# Altium footprint library 封装库.PcbLib: 755 footprints (part 4 of 48)
Each footprint in its own frame and in the unit in brackets; x right, y up, seen from the top. Pads: shape width x height; smd on the part's side, far side on the other; paste and mask are expansions set on the pad; w line width, h text height; cw(c..) or ccw(c..) is an arc to the next point about the centre after c.
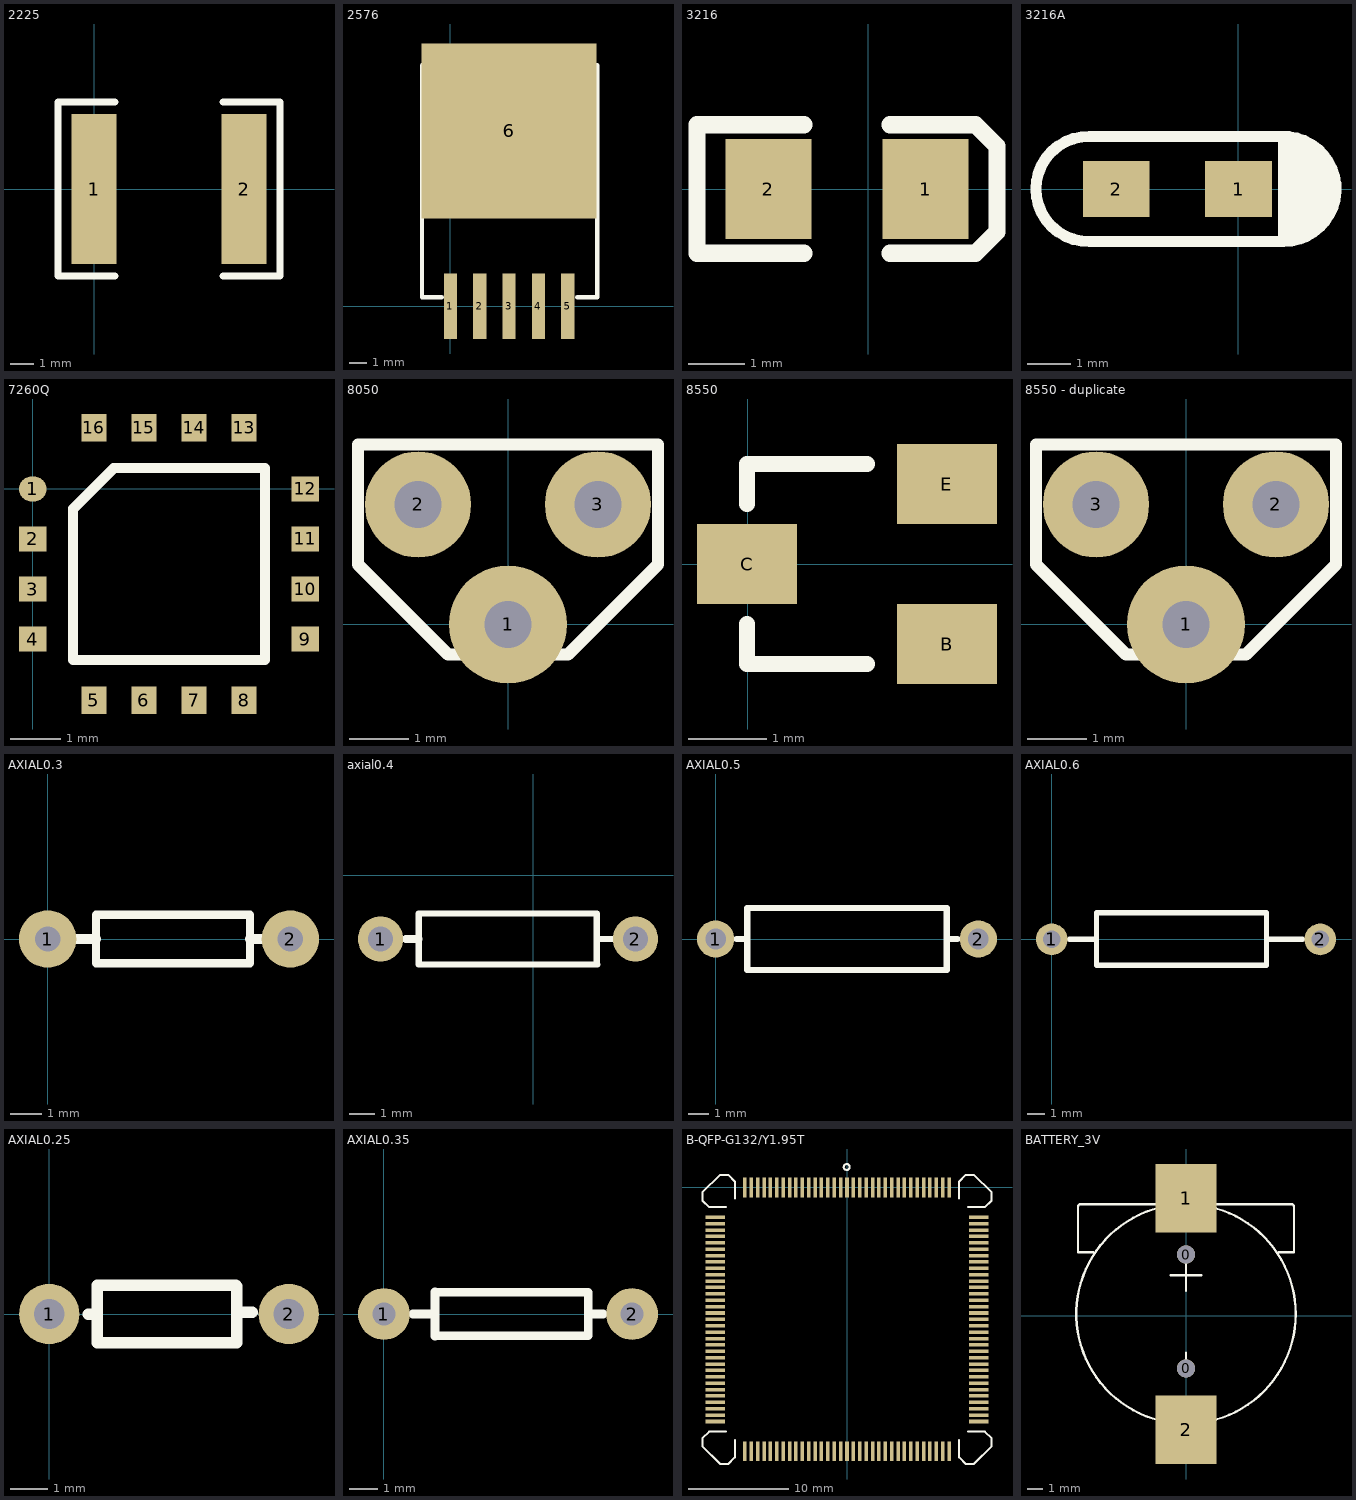
[diagram p3: the footprints below, top view; thin cyan lines are the x and y axes]

## 2225 [mm]
pads (2):
  rect 1.905x6.35 smd: 1(0,0) 2(6.35,0)
Top Overlay:
  lines w0.305: 0.889,-3.683 -1.524,-3.683 -1.524,3.683 0.889,3.683 ; 5.461,-3.683 7.874,-3.683 7.874,3.683 5.461,3.683

## 2576 [mil]
pads (6):
  rect 30x150 smd: 1(0,0) 2(67,0) 3(134,0) 4(201,0) 5(268,0)
  rect 400x400 smd: 6(134,400)
Top Overlay:
  lines w10: -20,20 -65,20 -65,550 335,550 335,20 290,20

## 3216 [mil]
pads (2):
  rect 60x70 smd: 1(40,0) 2(-70,0)
Top Overlay:
  lines w12: -45,-45 -120,-45 -120,45 -45,45 ; 15,-45 75,-45 90,-30 90,30 75,45 15,45

## 3216A [mil]
pads (2):
  rect 60x50 smd: 1(0.16,0.23) 2(-109.84,0.23)
Top Overlay:
  rectangle: 42.48,-40.13 66.1,43.54
  rectangle: 69.06,-9.61 85.79,16.96
  rectangle: 66.1,-31.27 81.85,30.74
  rectangle: 57.24,-36.19 71.02,38.61
  rectangle: 45.43,-43.08 62.17,41.57
  lines w10: -133.7,-47.02 40.51,-47.02 ; -133.71,47.47 39.53,47.47 ; -133.66,-47.01 cw(c-134.69,0.23) -133.66,47.47 ; 38.26,47.42 cw(c40.51,0.23) 40.51,-47.02 ; 40.51,45.51 40.51,-47.02

## 7260Q [mm]
pads (16):
  oval 0.55x0.5 smd: 1(0,0)
  rect 0.55x0.5 smd: 2(0,-1) 3(0,-2) 4(0,-3) 9(5.45,-3) 10(5.45,-2) 11(5.45,-1) 12(5.45,0)
  rect 0.5x0.55 smd: 5(1.225,-4.225) 6(2.225,-4.225) 7(3.225,-4.225) 8(4.225,-4.225) 13(4.225,1.225) 14(3.225,1.225) 15(2.225,1.225) 16(1.225,1.225)
Top Overlay:
  lines w0.2: 0.81,-3.415 0.81,-0.395 1.62,0.415 4.64,0.415 4.64,-3.415 0.81,-3.415

## 8050 [mm]
pads (3):
  round 2 hole 0.8: 1(0,0)
  round 1.8 hole 0.8: 2(-1.524,2.032) 3(1.524,2.032)
Top Overlay:
  lines w0.203: -2.54,1.016 -1.016,-0.508 1.016,-0.508 2.54,1.016 2.54,3.048 -2.54,3.048 -2.54,1.016

## 8550 [mil]
pads (3):
  rect 50x40 smd: B(99.7,-40) C(-0.3,0) E(99.7,40)
Top Overlay:
  lines w8: -0.3,-30 -0.3,-50 59.7,-50 ; -0.3,30 -0.3,50 59.7,50

## 8550 - duplicate [mm]
pads (3):
  round 2 hole 0.8: 1(0,0)
  round 1.8 hole 0.8: 2(1.524,2.032) 3(-1.524,2.032)
Top Overlay:
  lines w0.203: -2.54,1.016 -1.016,-0.508 1.016,-0.508 2.54,1.016 2.54,3.048 -2.54,3.048 -2.54,1.016

## AXIAL0.3 [mm]
pads (2):
  round 1.8 hole 0.8: 1(0,0) 2(7.62,0)
Top Overlay:
  lines w0.254: 1.524,-0.762 1.524,0.762 6.35,0.762 6.35,-0.762 1.524,-0.762
  lines w0.305: 0.762,0 1.524,0 ; 6.35,0 6.858,0

## axial0.4 [mm]
pads (2):
  round 1.8 hole 1: 1(-6.096,-2.54) 2(4.064,-2.54)
Top Overlay:
  lines w0.254: 2.516,-3.532 2.516,-1.524 -4.572,-1.524 -4.572,-3.556 2.54,-3.556 ; 2.516,-2.54 3.302,-2.54
  lines w0.305: -5.08,-2.54 -4.572,-2.54

## AXIAL0.5 [mm]
pads (2):
  round 1.8 hole 1: 1(0,0) 2(12.7,0)
Top Overlay:
  lines w0.3: 11.176,-1.5 11.176,1.5
  lines w0.305: 1.016,0 1.524,0 ; 11.176,-1.5 1.524,-1.5 1.524,1.5 11.176,1.5 ; 11.176,0 11.684,0

## AXIAL0.6 [mm]
pads (2):
  round 1.8 hole 1: 1(0,0) 2(15.24,0)
Top Overlay:
  lines w0.3: 12.192,-1.476 12.192,1.524
  lines w0.305: 1.016,0 2.54,0 ; 12.192,-1.476 2.54,-1.476 2.54,1.524 12.192,1.524 ; 12.192,0 14.224,0

## AXIAL0.25 [mm]
pads (2):
  round 1.6 hole 0.8: 1(0,0) 2(6.35,0)
Top Overlay:
  lines w0.3: 1.27,-0.762 4.974,-0.762 4.974,0.738 4.95,0.762 1.27,0.762
  lines w0.305: 1.041,0 1.27,0 ; 1.27,-0.762 1.27,0.762 ; 5.148,0.042 5.377,0.042

## AXIAL0.35 [mm]
pads (2):
  round 1.8 hole 0.8: 1(0,0) 2(8.636,0)
Top Overlay:
  lines w0.3: 1.778,-0.762 1.778,0.762 7.112,0.762 7.112,0 7.112,-0.762 1.778,-0.762
  lines w0.305: 1.016,0 1.778,0 ; 1.778,-0.762 1.778,0.762 ; 7.112,0 7.62,0

## B-QFP-G132/Y1.95T [mm]
pads (132):
  rect 0.35x1.95 smd: 1(0,0) 2(-0.635,0) 3(-1.27,0) 4(-1.905,0) 5(-2.54,0) 6(-3.175,0) 7(-3.81,0) 8(-4.445,0) 9(-5.08,0) 10(-5.715,0) 11(-6.35,0) 12(-6.985,0) 13(-7.62,0) 14(-8.255,0) 15(-8.89,0) 16(-9.525,0) 17(-10.16,0) 51(-10.16,-26.25) 52(-9.525,-26.25) 53(-8.89,-26.25) 54(-8.255,-26.25) 55(-7.62,-26.25) 56(-6.985,-26.25) 57(-6.35,-26.25) 58(-5.715,-26.25) 59(-5.08,-26.25) 60(-4.445,-26.25) 61(-3.81,-26.25) 62(-3.175,-26.25) 63(-2.54,-26.25) 64(-1.905,-26.25) 65(-1.27,-26.25) 66(-0.635,-26.25) 67(0,-26.25) 68(0.635,-26.25) 69(1.27,-26.25) 70(1.905,-26.25) 71(2.54,-26.25) 72(3.175,-26.25) 73(3.81,-26.25) 74(4.445,-26.25) 75(5.08,-26.25) 76(5.715,-26.25) 77(6.35,-26.25) 78(6.985,-26.25) 79(7.62,-26.25) 80(8.255,-26.25) 81(8.89,-26.25) 82(9.525,-26.25) 83(10.16,-26.25) 117(10.16,0) 118(9.525,0) 119(8.89,0) 120(8.255,0) 121(7.62,0) 122(6.985,0) 123(6.35,0) 124(5.715,0) 125(5.08,0) 126(4.445,0) 127(3.81,0) 128(3.175,0) 129(2.54,0) 130(1.905,0) 131(1.27,0) 132(0.635,0)
  rect 1.95x0.35 smd: 18(-13.125,-2.965) 19(-13.125,-3.6) 20(-13.125,-4.235) 21(-13.125,-4.87) 22(-13.125,-5.505) 23(-13.125,-6.14) 24(-13.125,-6.775) 25(-13.125,-7.41) 26(-13.125,-8.045) 27(-13.125,-8.68) 28(-13.125,-9.315) 29(-13.125,-9.95) 30(-13.125,-10.585) 31(-13.125,-11.22) 32(-13.125,-11.855) 33(-13.125,-12.49) 34(-13.125,-13.125) 35(-13.125,-13.76) 36(-13.125,-14.395) 37(-13.125,-15.03) 38(-13.125,-15.665) 39(-13.125,-16.3) 40(-13.125,-16.935) 41(-13.125,-17.57) 42(-13.125,-18.205) 43(-13.125,-18.84) 44(-13.125,-19.475) 45(-13.125,-20.11) 46(-13.125,-20.745) 47(-13.125,-21.38) 48(-13.125,-22.015) 49(-13.125,-22.65) 50(-13.125,-23.285) 84(13.125,-23.285) 85(13.125,-22.65) 86(13.125,-22.015) 87(13.125,-21.38) 88(13.125,-20.745) 89(13.125,-20.11) 90(13.125,-19.475) 91(13.125,-18.84) 92(13.125,-18.205) 93(13.125,-17.57) 94(13.125,-16.935) 95(13.125,-16.3) 96(13.125,-15.665) 97(13.125,-15.03) 98(13.125,-14.395) 99(13.125,-13.76) 100(13.125,-13.125) 101(13.125,-12.49) 102(13.125,-11.855) 103(13.125,-11.22) 104(13.125,-10.585) 105(13.125,-9.95) 106(13.125,-9.315) 107(13.125,-8.68) 108(13.125,-8.045) 109(13.125,-7.41) 110(13.125,-6.775) 111(13.125,-6.14) 112(13.125,-5.505) 113(13.125,-4.87) 114(13.125,-4.235) 115(13.125,-3.6) 116(13.125,-2.965)
Top Overlay:
  circle w0.2: c-0.03,2.035 r0.3
  lines w0.2: -12.02,-24.285 -13.717,-24.285 -14.387,-24.955 -14.387,-25.755 -12.63,-27.512 -11.83,-27.512 -11.16,-26.842 -11.16,-25.145 ; -12.02,-1.965 -13.717,-1.965 -14.387,-1.295 -14.387,-0.495 -12.63,1.263 -11.83,1.263 -11.16,0.593 -11.16,-1.105 ; 11.16,-25.145 11.16,-26.842 11.83,-27.512 12.63,-27.512 14.387,-25.755 14.387,-24.955 13.717,-24.285 12.02,-24.285 ; 11.16,-1.105 11.16,0.593 11.83,1.263 12.63,1.263 14.387,-0.495 14.387,-1.295 13.717,-1.965 12.02,-1.965

## BATTERY_3V [mm]
pads (4):
  round 1.2 hole 1.2: 0(0,-3.48) 0(0,4.013)
  rect 4x4.5 smd: 1(0,7.722) 2(0,-7.518)
Top Overlay:
  circle w0.152: c0,0.102 r7.22
  lines w0.152: -6.096,4.166 -7.112,4.166 -7.112,7.214 -7.004,7.322 0,7.322 7.004,7.322 7.112,7.214 7.112,4.166 6.096,4.166 ; -1.016,2.642 1.016,2.642 ; 0,-3.962 0,-2.438 ; 0,1.626 0,3.658